# Altium footprint library SMDLibrary.PcbLib: 309 footprints (part 12 of 20) (continued)
## LQFP176_FPT-176P-M03 [mm] (continued)
Top Overlay:
  circle w0.254: c0,0 r2
  circle w0.254: c-10,10 r0.3
  lines w0.254: -11.2,-11.2 -11.2,11.2 11.2,11.2 11.2,-11.2 -11.2,-11.2
3D body "LQFP176_FPT-176P-M03.stp": height 1.7, standoff 0, extent -11,-11 11,11

## LQFP208_FPT-208P-M06 [mm]
pads (208):
  rect 0.6x0.22 smd: 1(-14.7,12.75) 2(-14.7,12.25) 3(-14.7,11.75) 4(-14.7,11.25) 5(-14.7,10.75) 6(-14.7,10.25) 7(-14.7,9.75) 8(-14.7,9.25) 9(-14.7,8.75) 10(-14.7,8.25) 11(-14.7,7.75) 12(-14.7,7.25) 13(-14.7,6.75) 14(-14.7,6.25) 15(-14.7,5.75) 16(-14.7,5.25) 17(-14.7,4.75) 18(-14.7,4.25) 19(-14.7,3.75) 20(-14.7,3.25) 21(-14.7,2.75) 22(-14.7,2.25) 23(-14.7,1.75) 24(-14.7,1.25) 25(-14.7,0.75) 26(-14.7,0.25) 27(-14.7,-0.25) 28(-14.7,-0.75) 29(-14.7,-1.25) 30(-14.7,-1.75) 31(-14.7,-2.25) 32(-14.7,-2.75) 33(-14.7,-3.25) 34(-14.7,-3.75) 35(-14.7,-4.25) 36(-14.7,-4.75) 37(-14.7,-5.25) 38(-14.7,-5.75) 39(-14.7,-6.25) 40(-14.7,-6.75) 41(-14.7,-7.25) 42(-14.7,-7.75) 43(-14.7,-8.25) 44(-14.7,-8.75) 45(-14.7,-9.25) 46(-14.7,-9.75) 47(-14.7,-10.25) 48(-14.7,-10.75) 49(-14.7,-11.25) 50(-14.7,-11.75) 51(-14.7,-12.25) 52(-14.7,-12.75) 105(14.7,-12.75) 106(14.7,-12.25) 107(14.7,-11.75) 108(14.7,-11.25) 109(14.7,-10.75) 110(14.7,-10.25) 111(14.7,-9.75) 112(14.7,-9.25) 113(14.7,-8.75) 114(14.7,-8.25) 115(14.7,-7.75) 116(14.7,-7.25) 117(14.7,-6.75) 118(14.7,-6.25) 119(14.7,-5.75) 120(14.7,-5.25) 121(14.7,-4.75) 122(14.7,-4.25) 123(14.7,-3.75) 124(14.7,-3.25) 125(14.7,-2.75) 126(14.7,-2.25) 127(14.7,-1.75) 128(14.7,-1.25) 129(14.7,-0.75) 130(14.7,-0.25) 131(14.7,0.25) 132(14.7,0.75) 133(14.7,1.25) 134(14.7,1.75) 135(14.7,2.25) 136(14.7,2.75) 137(14.7,3.25) 138(14.7,3.75) 139(14.7,4.25) 140(14.7,4.75) 141(14.7,5.25) 142(14.7,5.75) 143(14.7,6.25) 144(14.7,6.75) 145(14.7,7.25) 146(14.7,7.75) 147(14.7,8.25) 148(14.7,8.75) 149(14.7,9.25) 150(14.7,9.75) 151(14.7,10.25) 152(14.7,10.75) 153(14.7,11.25) 154(14.7,11.75) 155(14.7,12.25) 156(14.7,12.75)
  rect 0.22x0.6 smd: 53(-12.75,-14.7) 54(-12.25,-14.7) 55(-11.75,-14.7) 56(-11.25,-14.7) 57(-10.75,-14.7) 58(-10.25,-14.7) 59(-9.75,-14.7) 60(-9.25,-14.7) 61(-8.75,-14.7) 62(-8.25,-14.7) 63(-7.75,-14.7) 64(-7.25,-14.7) 65(-6.75,-14.7) 66(-6.25,-14.7) 67(-5.75,-14.7) 68(-5.25,-14.7) 69(-4.75,-14.7) 70(-4.25,-14.7) 71(-3.75,-14.7) 72(-3.25,-14.7) 73(-2.75,-14.7) 74(-2.25,-14.7) 75(-1.75,-14.7) 76(-1.25,-14.7) 77(-0.75,-14.7) 78(-0.25,-14.7) 79(0.25,-14.7) 80(0.75,-14.7) 81(1.25,-14.7) 82(1.75,-14.7) 83(2.25,-14.7) 84(2.75,-14.7) 85(3.25,-14.7) 86(3.75,-14.7) 87(4.25,-14.7) 88(4.75,-14.7) 89(5.25,-14.7) 90(5.75,-14.7) 91(6.25,-14.7) 92(6.75,-14.7) 93(7.25,-14.7) 94(7.75,-14.7) 95(8.25,-14.7) 96(8.75,-14.7) 97(9.25,-14.7) 98(9.75,-14.7) 99(10.25,-14.7) 100(10.75,-14.7) 101(11.25,-14.7) 102(11.75,-14.7) 103(12.25,-14.7) 104(12.75,-14.7) 157(12.75,14.7) 158(12.25,14.7) 159(11.75,14.7) 160(11.25,14.7) 161(10.75,14.7) 162(10.25,14.7) 163(9.75,14.7) 164(9.25,14.7) 165(8.75,14.7) 166(8.25,14.7) 167(7.75,14.7) 168(7.25,14.7) 169(6.75,14.7) 170(6.25,14.7) 171(5.75,14.7) 172(5.25,14.7) 173(4.75,14.7) 174(4.25,14.7) 175(3.75,14.7) 176(3.25,14.7) 177(2.75,14.7) 178(2.25,14.7) 179(1.75,14.7) 180(1.25,14.7) 181(0.75,14.7) 182(0.25,14.7) 183(-0.25,14.7) 184(-0.75,14.7) 185(-1.25,14.7) 186(-1.75,14.7) 187(-2.25,14.7) 188(-2.75,14.7) 189(-3.25,14.7) 190(-3.75,14.7) 191(-4.25,14.7) 192(-4.75,14.7) 193(-5.25,14.7) 194(-5.75,14.7) 195(-6.25,14.7) 196(-6.75,14.7) 197(-7.25,14.7) 198(-7.75,14.7) 199(-8.25,14.7) 200(-8.75,14.7) 201(-9.25,14.7) 202(-9.75,14.7) 203(-10.25,14.7) 204(-10.75,14.7) 205(-11.25,14.7) 206(-11.75,14.7) 207(-12.25,14.7) 208(-12.75,14.7)
Top Overlay:
  circle w0.254: c0,0 r2
  circle w0.254: c-14,14 r0.3
  lines w0.254: -15.25,-15.25 -15.25,15.25 15.25,15.25 15.25,-15.25 -15.25,-15.25
3D body "LQFP208_FPT-208P-M06.stp": height 1.7, standoff 0, extent -15,-15 15,15

## LQFP_48 [mil]
pads (48):
  rect 58x9 smd paste+0 mask+0: 1(-166,108.27) 2(-166,88.58) 3(-166,68.9) 4(-166,49.21) 5(-166,29.53) 6(-166,9.84) 7(-166,-9.84) 8(-166,-29.53) 9(-166,-49.21) 10(-166,-68.9) 11(-166,-88.58) 12(-166,-108.27) 25(166,-108.27) 26(166,-88.58) 27(166,-68.9) 28(166,-49.21) 29(166,-29.53) 30(166,-9.84) 31(166,9.84) 32(166,29.53) 33(166,49.21) 34(166,68.9) 35(166,88.58) 36(166,108.27)
  rect 9x58 smd paste+0 mask+0: 13(-108.27,-166) 14(-88.58,-166) 15(-68.9,-166) 16(-49.21,-166) 17(-29.53,-166) 18(-9.84,-166) 19(9.84,-166) 20(29.53,-166) 21(49.21,-166) 22(68.9,-166) 23(88.58,-166) 24(108.27,-166) 37(108.27,166) 38(88.58,166) 39(68.9,166) 40(49.21,166) 41(29.53,166) 42(9.84,166) 43(-9.84,166) 44(-29.53,166) 45(-49.21,166) 46(-68.9,166) 47(-88.58,166) 48(-108.27,166)
Top Overlay:
  region: 56.71,205 41.71,205 41.71,215 56.71,215
  region: 205,-2.34 215,-2.34 215,-17.34 205,-17.34
  region: 37.03,-205 22.03,-205 22.03,-215 37.03,-215
  region: -205,-61.4 -215,-61.4 -215,-76.4 -205,-76.4
  lines w6: -147,-125.87 -147,-147 -125.87,-147 ; -147,125.87 -147,147 -125.87,147 ; 125.87,-147 147,-147 147,-125.87 ; 125.87,147 147,147 147,125.87
  text "*" at -232.5,108.11 h50
Mechanical 7:
  lines w1: -296,-142 -108.27,-142 ; -296,142 -108.27,142 ; -181,108.27 -181,371 ; -142,-296 -142,-108.27 ; 101,281 151,281 ; 108.27,-181 371,-181 ; 108.27,181 371,181 ; 142,-296 142,-108.27 ; 151,108.27 151,296 ; 166,88.58 296,88.58 ; 166,108.27 296,108.27 ; 181,296 181,108.27 181,371 ; 231,281 181,281 ; 281,38.58 281,88.58 ; 281,158.27 281,108.27 ; -281,-142 -276,-132 -286,-132 -281,-142 ; -281,-142 -281,142 ; -281,142 -276,132 -286,132 -281,142 ; -181,356 -171,351 -171,361 -181,356 ; -181,356 181,356 ; -142,-281 -132,-286 -132,-276 -142,-281 ; -142,-281 142,-281 ; 142,-281 132,-286 132,-276 142,-281 ; 151,281 141,276 141,286 151,281 ; 181,281 191,276 191,286 181,281 ; 181,356 171,351 171,361 181,356 ; 281,88.58 286,78.58 276,78.58 281,88.58 ; 281,108.27 286,118.27 276,118.27 281,108.27 ; 356,-181 361,-171 351,-171 356,-181 ; 356,-181 356,181 ; 356,181 361,171 351,171 356,181
  text "0.362in/9.195mm" at 376,-12.5 h25
  text "0.284in/7.214mm" at -488.5,-12.5 h25
  text "0.284in/7.214mm" at -93.75,-326 h25
  text "0.362in/9.195mm" at -93.75,376 h25
  text "0.03in/0.762mm" at 78.5,301 h25
  text "0.02in/0.5mm" at 301,85.93 h25
  text "Alt 2 Padstyle: OX90Y60D30P" at -337.5,-731 h50
  text "Alt 1 Padstyle: OX60Y90D30P" at -337.5,-671 h50
  text "Default Vert Padstyle: RX9Y58D0T" at -400,-491 h50
  text "Default Horiz Padstyle: RX9Y58D0T" at -412.5,-431 h50
Mechanical 13:
  drawing of 197 lines, arcs and shapes, not listed
  text "*" at -139.5,93.11 h50
Mechanical 15:
  region: -122.77,-152 -152,-152 -152,-122.77 -205,-122.77 -205,122.77 -152,122.77 -152,152 -122.77,152 -122.77,205 122.77,205 122.77,152 152,152 152,122.77 205,122.77 205,-122.77 152,-122.77 152,-152 122.77,-152 122.77,-205 -122.77,-205
  lines w6: -205,-122.77 -205,122.77 -152,122.77 -152,152 -122.77,152 -122.77,205 122.77,205 122.77,152 152,152 152,122.77 205,122.77 205,-122.77 152,-122.77 152,-152 122.77,-152 122.77,-205 -122.77,-205 -122.77,-152 -152,-152 -152,-122.77 -205,-122.77
3D body "LQFP-48.step": height 63.11, standoff 0, extent -180.98,-180.98 180.99,180.99
3D body: height 10, standoff 0, extent 0,0 10,10

## LQFP_48_L [mil]
pads (48):
  rect 46x7 smd paste+0 mask+0: 1(-164,108.27) 2(-164,88.58) 3(-164,68.9) 4(-164,49.21) 5(-164,29.53) 6(-164,9.84) 7(-164,-9.84) 8(-164,-29.53) 9(-164,-49.21) 10(-164,-68.9) 11(-164,-88.58) 12(-164,-108.27) 25(164,-108.27) 26(164,-88.58) 27(164,-68.9) 28(164,-49.21) 29(164,-29.53) 30(164,-9.84) 31(164,9.84) 32(164,29.53) 33(164,49.21) 34(164,68.9) 35(164,88.58) 36(164,108.27)
  rect 7x46 smd paste+0 mask+0: 13(-108.27,-164) 14(-88.58,-164) 15(-68.9,-164) 16(-49.21,-164) 17(-29.53,-164) 18(-9.84,-164) 19(9.84,-164) 20(29.53,-164) 21(49.21,-164) 22(68.9,-164) 23(88.58,-164) 24(108.27,-164) 37(108.27,164) 38(88.58,164) 39(68.9,164) 40(49.21,164) 41(29.53,164) 42(9.84,164) 43(-9.84,164) 44(-29.53,164) 45(-49.21,164) 46(-68.9,164) 47(-88.58,164) 48(-108.27,164)
Top Overlay:
  region: -197,-61.4 -207,-61.4 -207,-76.4 -197,-76.4
  region: 37.03,-197 22.03,-197 22.03,-207 37.03,-207
  region: 197,-2.34 207,-2.34 207,-17.34 197,-17.34
  region: 56.71,197 41.71,197 41.71,207 56.71,207
  lines w6: -147,-124.87 -147,-147 -124.87,-147 ; -147,124.87 -147,147 -124.87,147 ; 124.87,-147 147,-147 147,-124.87 ; 124.87,147 147,147 147,124.87
  text "*" at -224.5,108.11 h50
Mechanical 7:
  lines w1: -294,-142 -108.27,-142 ; -294,142 -108.27,142 ; -181,108.27 -181,369 ; -142,-294 -142,-108.27 ; 101,279 151,279 ; 108.27,-181 369,-181 ; 108.27,181 369,181 ; 142,-294 142,-108.27 ; 151,108.27 151,294 ; 164,88.58 294,88.58 ; 164,108.27 294,108.27 ; 181,294 181,108.27 181,369 ; 231,279 181,279 ; 279,38.58 279,88.58 ; 279,158.27 279,108.27 ; -279,-142 -279,142 ; -279,-142 -284,-132 -274,-132 -279,-142 ; -279,142 -284,132 -274,132 -279,142 ; -181,354 181,354 ; -181,354 -171,359 -171,349 -181,354 ; -142,-279 142,-279 ; -142,-279 -132,-274 -132,-284 -142,-279 ; 142,-279 132,-274 132,-284 142,-279 ; 151,279 141,284 141,274 151,279 ; 181,279 191,284 191,274 181,279 ; 181,354 171,359 171,349 181,354 ; 279,88.58 274,78.58 284,78.58 279,88.58 ; 279,108.27 274,118.27 284,118.27 279,108.27 ; 354,-181 354,181 ; 354,-181 349,-171 359,-171 354,-181 ; 354,181 349,171 359,171 354,181
  text "Default Horiz Padstyle: RX7Y46D0T" at -412.5,-429 h50
  text "Default Vert Padstyle: RX7Y46D0T" at -400,-489 h50
  text "Alt 1 Padstyle: OX60Y90D30P" at -337.5,-669 h50
  text "Alt 2 Padstyle: OX90Y60D30P" at -337.5,-729 h50
  text "0.02in/0.5mm" at 299,85.93 h25
  text "0.03in/0.762mm" at 78.5,299 h25
  text "0.362in/9.195mm" at -93.75,374 h25
  text "0.284in/7.214mm" at -93.75,-324 h25
  text "0.284in/7.214mm" at -486.5,-12.5 h25
  text "0.362in/9.195mm" at 374,-12.5 h25
Mechanical 13:
  drawing of 197 lines, arcs and shapes, not listed
  text "*" at -139.5,93.11 h50
Mechanical 15:
  region: -115.77,-146 -146,-146 -146,-115.77 -191,-115.77 -191,115.77 -146,115.77 -146,146 -115.77,146 -115.77,191 115.77,191 115.77,146 146,146 146,115.77 191,115.77 191,-115.77 146,-115.77 146,-146 115.77,-146 115.77,-191 -115.77,-191
  lines w6: -191,-115.77 -146,-115.77 -146,-146 -115.77,-146 -115.77,-191 115.77,-191 115.77,-146 146,-146 146,-115.77 191,-115.77 191,115.77 146,115.77 146,146 115.77,146 115.77,191 -115.77,191 -115.77,146 -146,146 -146,115.77 -191,115.77 -191,-115.77
3D body "LQFP-48-L.step": height 63.11, standoff 0, extent -180.98,-180.98 180.99,180.99
3D body: height 10, standoff 0, extent 0,0 10,10

## LQFP_48_M [mil]
pads (48):
  rect 70x11 smd paste+0 mask+0: 1(-168,108.27) 2(-168,88.58) 3(-168,68.9) 4(-168,49.21) 5(-168,29.53) 6(-168,9.84) 7(-168,-9.84) 8(-168,-29.53) 9(-168,-49.21) 10(-168,-68.9) 11(-168,-88.58) 12(-168,-108.27) 25(168,-108.27) 26(168,-88.58) 27(168,-68.9) 28(168,-49.21) 29(168,-29.53) 30(168,-9.84) 31(168,9.84) 32(168,29.53) 33(168,49.21) 34(168,68.9) 35(168,88.58) 36(168,108.27)
  rect 11x70 smd paste+0 mask+0: 13(-108.27,-168) 14(-88.58,-168) 15(-68.9,-168) 16(-49.21,-168) 17(-29.53,-168) 18(-9.84,-168) 19(9.84,-168) 20(29.53,-168) 21(49.21,-168) 22(68.9,-168) 23(88.58,-168) 24(108.27,-168) 37(108.27,168) 38(88.58,168) 39(68.9,168) 40(49.21,168) 41(29.53,168) 42(9.84,168) 43(-9.84,168) 44(-29.53,168) 45(-49.21,168) 46(-68.9,168) 47(-88.58,168) 48(-108.27,168)
Top Overlay:
  region: 56.71,213 41.71,213 41.71,223 56.71,223
  region: 213,-2.34 223,-2.34 223,-17.34 213,-17.34
  region: 37.03,-213 22.03,-213 22.03,-223 37.03,-223
  region: -213,-61.4 -223,-61.4 -223,-76.4 -213,-76.4
  lines w6: -147,-126.87 -147,-147 -126.87,-147 ; -147,126.87 -147,147 -126.87,147 ; 126.87,-147 147,-147 147,-126.87 ; 126.87,147 147,147 147,126.87
  text "*" at -240.5,108.11 h50
Mechanical 7:
  lines w1: -298,-142 -108.27,-142 ; -298,142 -108.27,142 ; -181,108.27 -181,373 ; -142,-298 -142,-108.27 ; 101,283 151,283 ; 108.27,-181 373,-181 ; 108.27,181 373,181 ; 142,-298 142,-108.27 ; 151,108.27 151,298 ; 168,88.58 298,88.58 ; 168,108.27 298,108.27 ; 181,298 181,108.27 181,373 ; 231,283 181,283 ; 283,38.58 283,88.58 ; 283,158.27 283,108.27 ; -283,-142 -278,-132 -288,-132 -283,-142 ; -283,-142 -283,142 ; -283,142 -278,132 -288,132 -283,142 ; -181,358 -171,353 -171,363 -181,358 ; -181,358 181,358 ; -142,-283 -132,-288 -132,-278 -142,-283 ; -142,-283 142,-283 ; 142,-283 132,-288 132,-278 142,-283 ; 151,283 141,278 141,288 151,283 ; 181,283 191,278 191,288 181,283 ; 181,358 171,353 171,363 181,358 ; 283,88.58 288,78.58 278,78.58 283,88.58 ; 283,108.27 288,118.27 278,118.27 283,108.27 ; 358,-181 363,-171 353,-171 358,-181 ; 358,-181 358,181 ; 358,181 363,171 353,171 358,181
  text "0.362in/9.195mm" at 378,-12.5 h25
  text "0.284in/7.214mm" at -490.5,-12.5 h25
  text "0.284in/7.214mm" at -93.75,-328 h25
  text "0.362in/9.195mm" at -93.75,378 h25
  text "0.03in/0.762mm" at 78.5,303 h25
  text "0.02in/0.5mm" at 303,85.93 h25
  text "Alt 2 Padstyle: OX90Y60D30P" at -337.5,-733 h50
  text "Alt 1 Padstyle: OX60Y90D30P" at -337.5,-673 h50
  text "Default Vert Padstyle: RX11Y70D0T" at -412.5,-493 h50
  text "Default Horiz Padstyle: RX11Y70D0T" at -425,-433 h50
Mechanical 13:
  drawing of 197 lines, arcs and shapes, not listed
  text "*" at -139.5,93.11 h50
Mechanical 15:
  region: -133.77,-162 -162,-162 -162,-133.77 -223,-133.77 -223,133.77 -162,133.77 -162,162 -133.77,162 -133.77,223 133.77,223 133.77,162 162,162 162,133.77 223,133.77 223,-133.77 162,-133.77 162,-162 133.77,-162 133.77,-223 -133.77,-223
  lines w6: -223,-133.77 -223,133.77 -162,133.77 -162,162 -133.77,162 -133.77,223 133.77,223 133.77,162 162,162 162,133.77 223,133.77 223,-133.77 162,-133.77 162,-162 133.77,-162 133.77,-223 -133.77,-223 -133.77,-162 -162,-162 -162,-133.77 -223,-133.77
3D body: height 10, standoff 0, extent 0,0 10,10
3D body "LQFP-48-M.step": height 63.11, standoff 0, extent -180.98,-180.98 180.99,180.99

## LQFP_64 [mil]
pads (64):
  rect 58x9 smd paste+0 mask+0: 1(-221.5,147.64) 2(-221.5,127.95) 3(-221.5,108.27) 4(-221.5,88.58) 5(-221.5,68.9) 6(-221.5,49.21) 7(-221.5,29.53) 8(-221.5,9.84) 9(-221.5,-9.84) 10(-221.5,-29.53) 11(-221.5,-49.21) 12(-221.5,-68.9) 13(-221.5,-88.58) 14(-221.5,-108.27) 15(-221.5,-127.95) 16(-221.5,-147.64) 33(221.5,-147.64) 34(221.5,-127.95) 35(221.5,-108.27) 36(221.5,-88.58) 37(221.5,-68.9) 38(221.5,-49.21) 39(221.5,-29.53) 40(221.5,-9.84) 41(221.5,9.84) 42(221.5,29.53) 43(221.5,49.21) 44(221.5,68.9) 45(221.5,88.58) 46(221.5,108.27) 47(221.5,127.95) 48(221.5,147.64)
  rect 9x58 smd paste+0 mask+0: 17(-147.64,-221.5) 18(-127.95,-221.5) 19(-108.27,-221.5) 20(-88.58,-221.5) 21(-68.9,-221.5) 22(-49.21,-221.5) 23(-29.53,-221.5) 24(-9.84,-221.5) 25(9.84,-221.5) 26(29.53,-221.5) 27(49.21,-221.5) 28(68.9,-221.5) 29(88.58,-221.5) 30(108.27,-221.5) 31(127.95,-221.5) 32(147.64,-221.5) 49(147.64,221.5) 50(127.95,221.5) 51(108.27,221.5) 52(88.58,221.5) 53(68.9,221.5) 54(49.21,221.5) 55(29.53,221.5) 56(9.84,221.5) 57(-9.84,221.5) 58(-29.53,221.5) 59(-49.21,221.5) 60(-68.9,221.5) 61(-88.58,221.5) 62(-108.27,221.5) 63(-127.95,221.5) 64(-147.64,221.5)
Top Overlay:
  region: -260.5,-22.03 -270.5,-22.03 -270.5,-37.03 -260.5,-37.03
  region: -81.08,-260.5 -96.08,-260.5 -96.08,-270.5 -81.08,-270.5
  region: 115.77,-260.5 100.77,-260.5 100.77,-270.5 115.77,-270.5
  region: 260.5,-2.34 270.5,-2.34 270.5,-17.34 260.5,-17.34
  region: 135.45,260.5 120.45,260.5 120.45,270.5 135.45,270.5
  region: -61.4,260.5 -76.4,260.5 -76.4,270.5 -61.4,270.5
  lines w6: -204,-165.24 -204,-204 -165.24,-204 ; -204,165.24 -204,204 -165.24,204 ; 165.24,-204 204,-204 204,-165.24 ; 165.24,204 204,204 204,165.24
  text "*" at -288,147.48 h50
Mechanical 7:
  lines w1: -351.5,-199 -147.64,-199 ; -351.5,199 -147.64,199 ; -236.5,147.64 -236.5,426.5 ; -199,-351.5 -199,-147.64 ; 147.64,-236.5 426.5,-236.5 ; 147.64,236.5 426.5,236.5 ; 156.5,336.5 206.5,336.5 ; 199,-351.5 199,-147.64 ; 206.5,147.64 206.5,351.5 ; 221.5,127.95 351.5,127.95 ; 221.5,147.64 351.5,147.64 ; 236.5,351.5 236.5,147.64 236.5,426.5 ; 286.5,336.5 236.5,336.5 ; 336.5,77.95 336.5,127.95 ; 336.5,197.64 336.5,147.64 ; -336.5,-199 -336.5,199 ; -336.5,-199 -341.5,-189 -331.5,-189 -336.5,-199 ; -336.5,199 -341.5,189 -331.5,189 -336.5,199 ; -236.5,411.5 236.5,411.5 ; -236.5,411.5 -226.5,416.5 -226.5,406.5 -236.5,411.5 ; -199,-336.5 199,-336.5 ; -199,-336.5 -189,-331.5 -189,-341.5 -199,-336.5 ; 199,-336.5 189,-331.5 189,-341.5 199,-336.5 ; 206.5,336.5 196.5,341.5 196.5,331.5 206.5,336.5 ; 236.5,336.5 246.5,341.5 246.5,331.5 236.5,336.5 ; 236.5,411.5 226.5,416.5 226.5,406.5 236.5,411.5 ; 336.5,127.95 331.5,117.95 341.5,117.95 336.5,127.95 ; 336.5,147.64 331.5,157.64 341.5,157.64 336.5,147.64 ; 411.5,-236.5 411.5,236.5 ; 411.5,-236.5 406.5,-226.5 416.5,-226.5 411.5,-236.5 ; 411.5,236.5 406.5,226.5 416.5,226.5 411.5,236.5
  text "Default Horiz Padstyle: RX9Y58D0T" at -412.5,-486.5 h50
  text "Default Vert Padstyle: RX9Y58D0T" at -400,-546.5 h50
  text "Alt 1 Padstyle: OX60Y90D30P" at -337.5,-726.5 h50
  text "Alt 2 Padstyle: OX90Y60D30P" at -337.5,-786.5 h50
  text "0.02in/0.5mm" at 356.5,125.3 h25
  text "0.03in/0.762mm" at 134,356.5 h25
  text "0.473in/12.014mm" at -100,431.5 h25
  text "0.398in/10.109mm" at -100,-381.5 h25
  text "0.398in/10.109mm" at -556.5,-12.5 h25
  text "0.473in/12.014mm" at 431.5,-12.5 h25
Mechanical 13:
  drawing of 261 lines, arcs and shapes, not listed
  text "*" at -196.5,132.48 h50
Mechanical 15:
  region: -162.14,-209 -209,-209 -209,-162.14 -260.5,-162.14 -260.5,162.14 -209,162.14 -209,209 -162.14,209 -162.14,260.5 162.14,260.5 162.14,209 209,209 209,162.14 260.5,162.14 260.5,-162.14 209,-162.14 209,-209 162.14,-209 162.14,-260.5 -162.14,-260.5
  lines w6: -260.5,-162.14 -209,-162.14 -209,-209 -162.14,-209 -162.14,-260.5 162.14,-260.5 162.14,-209 209,-209 209,-162.14 260.5,-162.14 260.5,162.14 209,162.14 209,209 162.14,209 162.14,260.5 -162.14,260.5 -162.14,209 -209,209 -209,162.14 -260.5,162.14 -260.5,-162.14
3D body "LQFP-64.step": height 63.11, standoff 0, extent -236.49,-236.49 236.5,236.5
3D body: height 10, standoff 0, extent 0,0 10,10

## LQFP_64_L [mil]
pads (64):
  rect 46x7 smd paste+0 mask+0: 1(-219.5,147.64) 2(-219.5,127.95) 3(-219.5,108.27) 4(-219.5,88.58) 5(-219.5,68.9) 6(-219.5,49.21) 7(-219.5,29.53) 8(-219.5,9.84) 9(-219.5,-9.84) 10(-219.5,-29.53) 11(-219.5,-49.21) 12(-219.5,-68.9) 13(-219.5,-88.58) 14(-219.5,-108.27) 15(-219.5,-127.95) 16(-219.5,-147.64) 33(219.5,-147.64) 34(219.5,-127.95) 35(219.5,-108.27) 36(219.5,-88.58) 37(219.5,-68.9) 38(219.5,-49.21) 39(219.5,-29.53) 40(219.5,-9.84) 41(219.5,9.84) 42(219.5,29.53) 43(219.5,49.21) 44(219.5,68.9) 45(219.5,88.58) 46(219.5,108.27) 47(219.5,127.95) 48(219.5,147.64)
  rect 7x46 smd paste+0 mask+0: 17(-147.64,-219.5) 18(-127.95,-219.5) 19(-108.27,-219.5) 20(-88.58,-219.5) 21(-68.9,-219.5) 22(-49.21,-219.5) 23(-29.53,-219.5) 24(-9.84,-219.5) 25(9.84,-219.5) 26(29.53,-219.5) 27(49.21,-219.5) 28(68.9,-219.5) 29(88.58,-219.5) 30(108.27,-219.5) 31(127.95,-219.5) 32(147.64,-219.5) 49(147.64,219.5) 50(127.95,219.5) 51(108.27,219.5) 52(88.58,219.5) 53(68.9,219.5) 54(49.21,219.5) 55(29.53,219.5) 56(9.84,219.5) 57(-9.84,219.5) 58(-29.53,219.5) 59(-49.21,219.5) 60(-68.9,219.5) 61(-88.58,219.5) 62(-108.27,219.5) 63(-127.95,219.5) 64(-147.64,219.5)
Top Overlay:
  region: -252.5,-22.03 -262.5,-22.03 -262.5,-37.03 -252.5,-37.03
  region: -81.08,-252.5 -96.08,-252.5 -96.08,-262.5 -81.08,-262.5
  region: 115.77,-252.5 100.77,-252.5 100.77,-262.5 115.77,-262.5
  region: 252.5,-2.34 262.5,-2.34 262.5,-17.34 252.5,-17.34
  region: 135.45,252.5 120.45,252.5 120.45,262.5 135.45,262.5
  region: -61.4,252.5 -76.4,252.5 -76.4,262.5 -61.4,262.5
  lines w6: -204,-164.24 -204,-204 -164.24,-204 ; -204,164.24 -204,204 -164.24,204 ; 164.24,-204 204,-204 204,-164.24 ; 164.24,204 204,204 204,164.24
  text "*" at -280,147.48 h50
Mechanical 7:
  lines w1: -349.5,-199 -147.64,-199 ; -349.5,199 -147.64,199 ; -236.5,147.64 -236.5,424.5 ; -199,-349.5 -199,-147.64 ; 147.64,-236.5 424.5,-236.5 ; 147.64,236.5 424.5,236.5 ; 156.5,334.5 206.5,334.5 ; 199,-349.5 199,-147.64 ; 206.5,147.64 206.5,349.5 ; 219.5,127.95 349.5,127.95 ; 219.5,147.64 349.5,147.64 ; 236.5,349.5 236.5,147.64 236.5,424.5 ; 286.5,334.5 236.5,334.5 ; 334.5,77.95 334.5,127.95 ; 334.5,197.64 334.5,147.64 ; -334.5,-199 -334.5,199 ; -334.5,-199 -339.5,-189 -329.5,-189 -334.5,-199 ; -334.5,199 -339.5,189 -329.5,189 -334.5,199 ; -236.5,409.5 236.5,409.5 ; -236.5,409.5 -226.5,414.5 -226.5,404.5 -236.5,409.5 ; -199,-334.5 199,-334.5 ; -199,-334.5 -189,-329.5 -189,-339.5 -199,-334.5 ; 199,-334.5 189,-329.5 189,-339.5 199,-334.5 ; 206.5,334.5 196.5,339.5 196.5,329.5 206.5,334.5 ; 236.5,334.5 246.5,339.5 246.5,329.5 236.5,334.5 ; 236.5,409.5 226.5,414.5 226.5,404.5 236.5,409.5 ; 334.5,127.95 329.5,117.95 339.5,117.95 334.5,127.95 ; 334.5,147.64 329.5,157.64 339.5,157.64 334.5,147.64 ; 409.5,-236.5 409.5,236.5 ; 409.5,-236.5 404.5,-226.5 414.5,-226.5 409.5,-236.5 ; 409.5,236.5 404.5,226.5 414.5,226.5 409.5,236.5
  text "Default Horiz Padstyle: RX7Y46D0T" at -412.5,-484.5 h50
  text "Default Vert Padstyle: RX7Y46D0T" at -400,-544.5 h50
  text "Alt 1 Padstyle: OX60Y90D30P" at -337.5,-724.5 h50
  text "Alt 2 Padstyle: OX90Y60D30P" at -337.5,-784.5 h50
  text "0.02in/0.5mm" at 354.5,125.3 h25
  text "0.03in/0.762mm" at 134,354.5 h25
  text "0.473in/12.014mm" at -100,429.5 h25
  text "0.398in/10.109mm" at -100,-379.5 h25
  text "0.398in/10.109mm" at -554.5,-12.5 h25
  text "0.473in/12.014mm" at 429.5,-12.5 h25
Mechanical 13:
  drawing of 261 lines, arcs and shapes, not listed
  text "*" at -196.5,132.48 h50
Mechanical 15:
  region: -155.14,-203 -203,-203 -203,-155.14 -246.5,-155.14 -246.5,155.14 -203,155.14 -203,203 -155.14,203 -155.14,246.5 155.14,246.5 155.14,203 203,203 203,155.14 246.5,155.14 246.5,-155.14 203,-155.14 203,-203 155.14,-203 155.14,-246.5 -155.14,-246.5
  lines w6: -246.5,-155.14 -203,-155.14 -203,-203 -155.14,-203 -155.14,-246.5 155.14,-246.5 155.14,-203 203,-203 203,-155.14 246.5,-155.14 246.5,155.14 203,155.14 203,203 155.14,203 155.14,246.5 -155.14,246.5 -155.14,203 -203,203 -203,155.14 -246.5,155.14 -246.5,-155.14
3D body "LQFP-64-L.step": height 63.11, standoff 0, extent -236.49,-236.49 236.5,236.5
3D body: height 10, standoff 0, extent 0,0 10,10